# Altium footprint library Misc.PCBLIB: 128 footprints (part 3 of 8)
Each footprint in its own frame and in the unit in brackets; x right, y up, seen from the top. Pads: shape width x height; smd on the part's side, far side on the other; paste and mask are expansions set on the pad; w line width, h text height; cw(c..) or ccw(c..) is an arc to the next point about the centre after c.
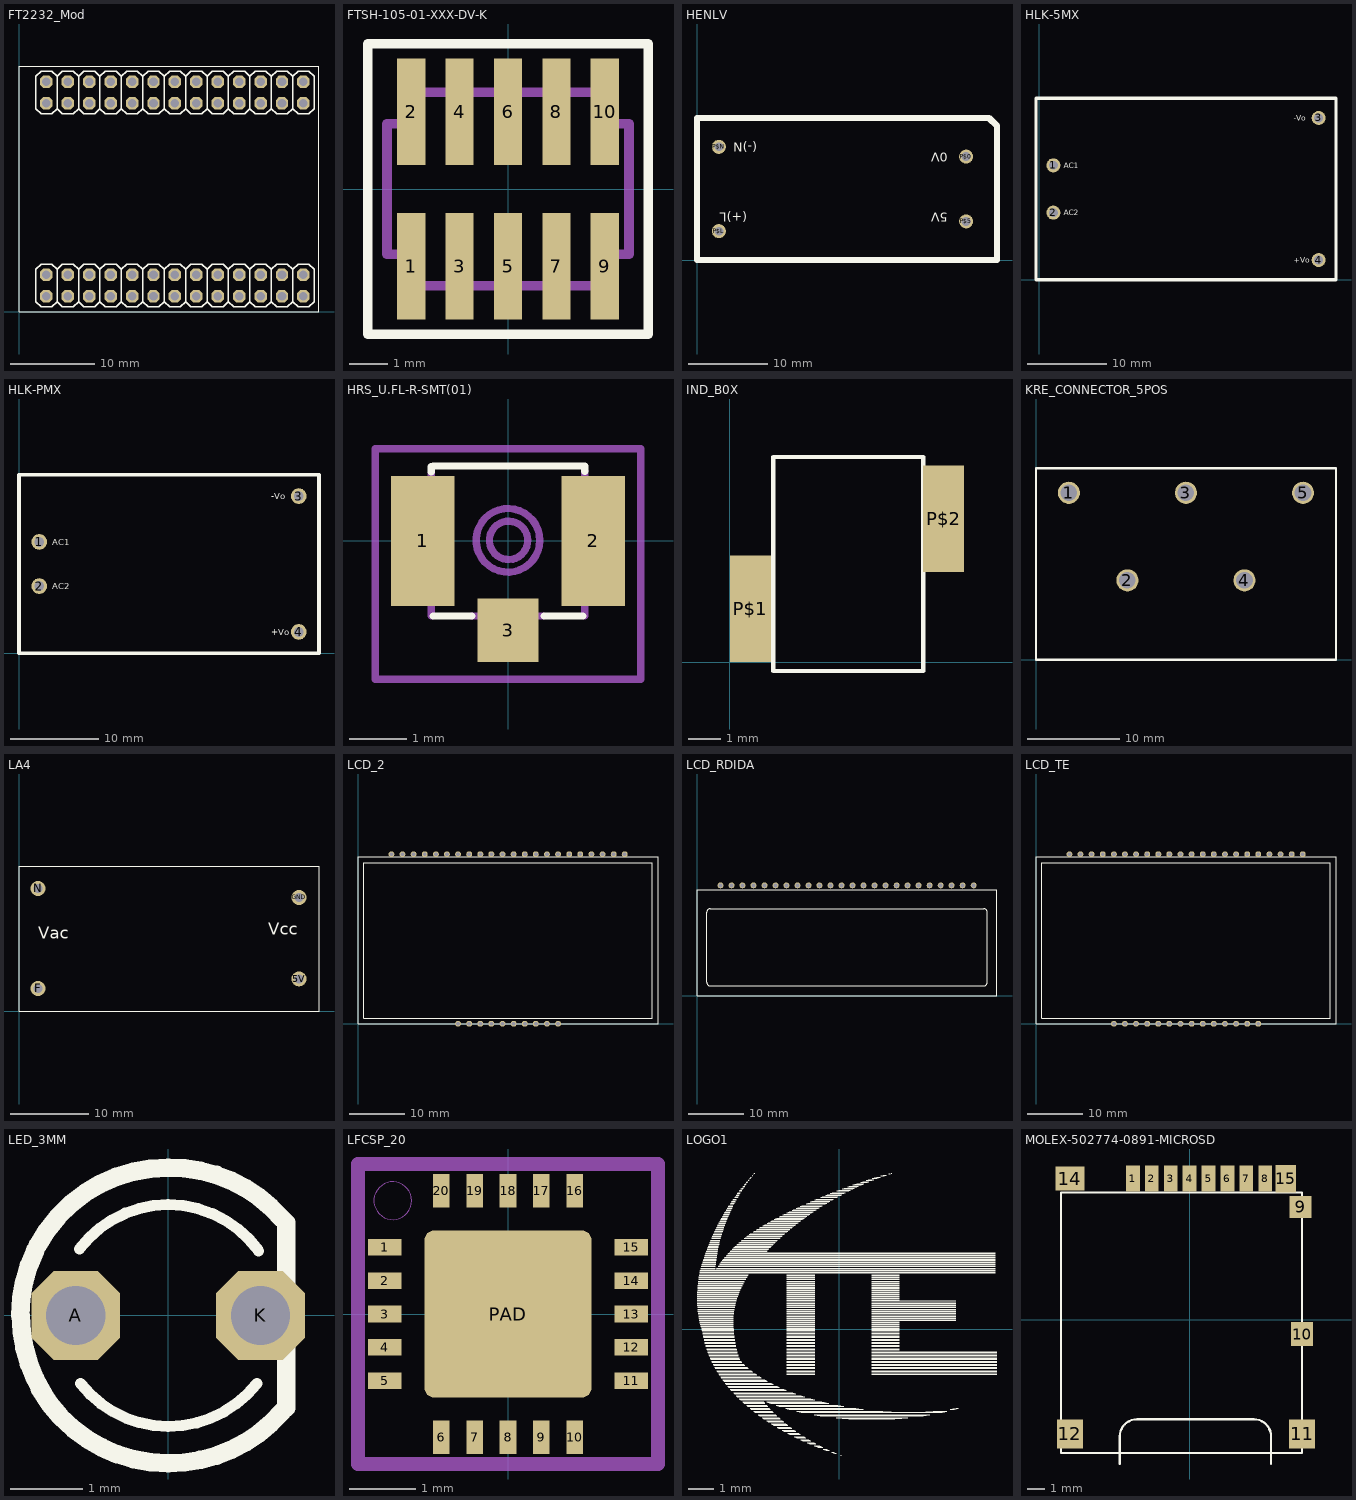
[diagram p2: the footprints below, top view; thin cyan lines are the x and y axes]

## FT2232_Mod [mil]
pads (52):
  oct 58.09x58.09 hole 40: CN2-1(127.95,73.23) CN2-2(127.95,173.23) CN2-3(227.95,73.23) CN2-4(227.95,173.23) CN2-5(327.95,73.23) CN2-6(327.95,173.23) CN2-7(427.95,73.23) CN2-8(427.95,173.23) CN2-9(527.95,73.23) CN2-10(527.95,173.23) CN2-11(627.95,73.23) CN2-12(627.95,173.23) CN2-13(727.95,73.23) CN2-14(727.95,173.23) CN2-15(827.95,73.23) CN2-16(827.95,173.23) CN2-17(927.95,73.23) CN2-18(927.95,173.23) CN2-19(1027.95,73.23) CN2-20(1027.95,173.23) CN2-21(1127.95,73.23) CN2-22(1127.95,173.23) CN2-23(1227.95,73.23) CN2-24(1227.95,173.23) CN2-25(1327.95,73.23) CN2-26(1327.95,173.23) CN3-1(127.95,974.41) CN3-2(127.95,1074.41) CN3-3(227.95,974.41) CN3-4(227.95,1074.41) CN3-5(327.95,974.41) CN3-6(327.95,1074.41) CN3-7(427.95,974.41) CN3-8(427.95,1074.41) CN3-9(527.95,974.41) CN3-10(527.95,1074.41) CN3-11(627.95,974.41) CN3-12(627.95,1074.41) CN3-13(727.95,974.41) CN3-14(727.95,1074.41) CN3-15(827.95,974.41) CN3-16(827.95,1074.41) CN3-17(927.95,974.41) CN3-18(927.95,1074.41) CN3-19(1027.95,974.41) CN3-20(1027.95,1074.41) CN3-21(1127.95,974.41) CN3-22(1127.95,1074.41) CN3-23(1227.95,974.41) CN3-24(1227.95,1074.41) CN3-25(1327.95,974.41) CN3-26(1327.95,1074.41)
Top Overlay:
  drawing of 188 lines, arcs and shapes, not listed
Mechanical 2:
  drawing of 52 lines, arcs and shapes, not listed
3D body "User Library-FT4232H-USB to UART.STEP": height 550.39, standoff 3.65, extent -22.05,0.01 1404.73,1147.64

## FTSH-105-01-XXX-DV-K [mil]
pads (10):
  rect 29x110 smd mask+2: 1(-100,-80) 2(-100,80) 3(-50,-80) 4(-50,80) 5(0,-80) 6(0,80) 7(50,-80) 8(50,80) 9(100,-80) 10(100,80)
Top Overlay:
  lines w10: -145,-150 -145,150 145,150 145,-150 -145,-150
Mechanical 1:
  lines w10: -125,-67.5 -125,67.5 -100,67.5 -100,100 100,100 100,67.5 125,67.5 125,-67.5 100,-67.5 100,-100 -100,-100 -100,-67.5 -125,-67.5
  text "J1" at -17.14,-17.5 h25

## HENLV [mil]
pads (4):
  round 70 hole 44: P$0(1343,516) P$5(1343,193) P$L(109,144) P$N(109,565)
Top Overlay:
  lines w32: 0,0 1497,0 1497,670 1457,709 0,709 0,0
  text "(+)L" at 250,250 h77.5
  text "(-)N" at 300,600 h77.5
  text "0V" at 1250,550 h77.5
  text "5V" at 1250,250 h77.5

## HLK-5MX [mil] "5W power supply"
pads (4):
  round 70 hole 44: 1(70.87,570.87) 2(70.87,334.65) 3(1393.7,807.09) 4(1393.7,98.43)
Top Overlay:
  lines w15.75: -15.75,0 -15.75,905.51 1480.32,905.51 1480.32,0 -15.75,0
  text "+Vo" at 1270.67,84.65 h27.56
  text "-Vo" at 1270.67,793.31 h27.56
  text "AC1" at 122.05,557.09 h27.56
  text "AC2" at 122.05,320.87 h27.56
3D body "User Library-HLK-5M05.step": height 708.67, standoff -196.85, extent -15.74,0.01 1480.33,905.52

## HLK-PMX [mil] "3W power supply"
pads (4):
  round 70 hole 44: 1(90.55,496.06) 2(90.55,299.21) 3(1248.03,700.79) 4(1248.03,94.49)
Top Overlay:
  lines w15.75: 0,0 0,795.28 1338.58,795.28 1338.58,0 0,0
  text "+Vo" at 1125,80.71 h27.56
  text "-Vo" at 1125,687.01 h27.56
  text "AC1" at 148.62,481.3 h27.56
  text "AC2" at 148.62,285.43 h27.56
3D body "HLK-PMX v2.step": height 590.94, standoff -98.43, extent 0.01,0 1338.59,795.28

## HRS_U.FL-R-SMT(01) [mm]
pads (3):
  rect 1.1x2.25 smd: 1(-1.475,0) 2(1.475,0)
  rect 1.05x1.1 smd: 3(0,-1.55)
Top Overlay:
  lines w0.127: -1.33,1.2 -1.33,1.29 ; -1.3,-1.3 -0.63,-1.3 ; -1.3,1.3 1.3,1.3 ; 0.63,-1.3 1.3,-1.3 ; 1.33,1.21 1.33,1.3
Mechanical 4:
  circle w0.127: c0.01,0.01 r0.332
  circle w0.127: c0,0.01 r0.552
  lines w0.127: -1.57,-0.89 -1.33,-0.89 -1.33,-0.9 ; -1.57,0.87 -1.33,0.87 -1.33,0.88 ; -1.56,-0.9 -1.56,0.88 ; -1.33,1.17 -1.33,-1.3 -1.31,-1.3 ; -0.63,-1.3 0.61,-1.3 ; 1.33,-1.3 1.33,1.21 ; 1.34,-0.91 1.34,-0.9 1.57,-0.9 1.57,0.88 1.38,0.88 ; -2.3,-2.4 -2.3,1.6 2.3,1.6 2.3,-2.4 -2.3,-2.4
3D body "SW3dPS-UFL-R-SMD.STEP": height 1.25, standoff 0, extent -1.7,-1.55 1.7,1.55

## IND_B0X [mil]
pads (2):
  rect 50x130 smd: P$1(25,65) P$2(261,175)
Top Overlay:
  lines w5: 53,-10.63 53,250 236,250 236,-10.63 53,-10.63

## KRE_CONNECTOR_5POS [mm] "KRE Connector 5pos 1kV"
pads (5):
  round 2.4 hole 1.8: 1(3.57,18.1) 2(9.92,8.6) 3(16.27,18.1) 4(22.62,8.6) 5(28.97,18.1)
Top Overlay:
  lines w0.254: 0,0 0,20.75 32.55,20.75 32.55,0 0,0

## LA4 [mil]
pads (4):
  round 76 hole 44: 5V(1400,163) F(95,115) GND(1400,570) N(95,615)
Top Overlay:
  lines w5: 0,0 0,725 1500,725 1500,0 0,0
  text "Vcc" at 1245,365 h102.3
  text "Vac" at 95,345 h102.3

## LCD_2 [mil]
pads (32):
  round 42 hole 28: 1(1890,1201) 2(1812,1201) 3(1733,1201) 4(1654,1201) 5(1575,1201) 6(1497,1201) 7(1418,1201) 8(1339,1201) 9(1260,1201) 10(1182,1201) 11(1103,1201) 12(1024,1201) 13(945,1201) 14(867,1201) 15(788,1201) 16(709,1201) 17(630,1201) 18(552,1201) 19(473,1201) 20(394,1201) 21(315,1201) 22(237,1201) 23(1418,0) 24(1339,0) 25(1260,0) 26(1182,0) 27(1103,0) 28(1024,0) 29(945,0) 30(867,0) 31(788,0) 32(709,0)
Top Overlay:
  lines w5: 0,0 2126,0 2126,1182 0,1182 0,0 ; 40,40 2087,40 2087,1142 40,1142 40,40

## LCD_RDIDA [mil]
pads (24):
  round 42 hole 28: P$1(168,788) P$2(247,788) P$3(325,788) P$4(404,788) P$5(483,788) P$6(562,788) P$7(640,788) P$8(719,788) P$9(798,788) P$10(876,788) P$11(955,788) P$12(1034,788) P$13(1113,788) P$14(1191,788) P$15(1270,788) P$16(1349,788) P$17(1428,788) P$18(1506,788) P$19(1585,788) P$20(1664,788) P$21(1743,788) P$22(1821,788) P$23(1900,788) P$24(1979,788)
Top Overlay:
  lines w5: 0,0 0,758 2146,758 2146,0 0,0 ; 69,94 ccw(c94,94) 94,69 2052,69 ccw(c2052,94) 2077,94 2077,596 ccw(c2052,596) 2052,621 94,621 ccw(c94,596) 69,596 69,94

## LCD_TE [mil]
pads (36):
  round 42 hole 28: 1(237,1201) 2(315,1201) 3(394,1201) 4(473,1201) 5(552,1201) 6(630,1201) 7(709,1201) 8(788,1201) 9(867,1201) 10(945,1201) 11(1024,1201) 12(1103,1201) 13(1182,1201) 14(1260,1201) 15(1339,1201) 16(1418,1201) 17(1497,1201) 18(1575,1201) 19(1654,1201) 20(1733,1201) 21(1812,1201) 22(1890,1201) 23(552,0) 24(630,0) 25(709,0) 26(788,0) 27(867,0) 28(945,0) 29(1024,0) 30(1103,0) 31(1182,0) 32(1260,0) 33(1339,0) 34(1418,0) 35(1497,0) 36(1575,0)
Top Overlay:
  lines w5: 0,0 2126,0 2126,1182 0,1182 0,0 ; 40,40 2087,40 2087,1142 40,1142 40,40
3D body: height 551.18, standoff 468.5, extent 0,0 2126,1182

## LED_3MM [mil]
pads (2):
  oct 48x48 hole 32: A(-50,0) K(50,0)
Top Overlay:
  lines w6: -48,36 cw(c0,0) 0,60 cw(c0.21,-0.11) 49,35 ; -47.36,-36.83 ccw(c0,0) 0,-60 ccw(c0.32,0.65) 48,-36.83
  lines w10: -80.01,0.22 cw(c-0.01,0.23) -71.85,35.43 ; -79.72,0 ccw(c0.28,0) -67.85,-41.93 ; -70.59,38 cw(c-0.29,0.18) 0,80 cw(c1.11,-0.19) 62,52 ; -69.46,-39.69 ccw(c0,0) 0,-80 ccw(c0.47,1) 62,-51.68 ; 63.99,-49.84 63.99,50.16
3D body "User Library-led 3mm black.STEP": height 265.87, standoff -28.43, extent -65.51,-65.07 61,64.74

## LFCSP_20 [mm]
pads (21):
  rect 0.5x0.25 smd: 1(-1.85,1) 2(-1.85,0.5) 3(-1.85,0) 4(-1.85,-0.5) 5(-1.85,-1) 11(1.85,-1) 12(1.85,-0.5) 13(1.85,0) 14(1.85,0.5) 15(1.85,1)
  rect 0.25x0.5 smd: 6(-1,-1.85) 7(-0.5,-1.85) 8(0,-1.85) 9(0.5,-1.85) 10(1,-1.85) 16(1,1.85) 17(0.5,1.85) 18(0,1.85) 19(-0.5,1.85) 20(-1,1.85)
  rrect10% 2.5x2.5 smd paste-2: PAD(0,0)
Top Paste:
  region: 0.027,0.507 0.053,0.505 0.079,0.502 0.106,0.497 0.131,0.491 0.157,0.483 0.182,0.474 0.207,0.464 0.231,0.453 0.254,0.44 0.277,0.426 0.299,0.411 0.32,0.395 0.34,0.378 0.359,0.359 0.378,0.34 0.395,0.32 0.411,0.299 0.426,0.277 0.44,0.254 0.453,0.231 0.464,0.207 0.474,0.182 0.483,0.157 0.491,0.131 0.497,0.106 0.502,0.079 0.505,0.053 0.507,0.027 0.508,0 0.507,-0.027 0.505,-0.053 0.502,-0.079 0.497,-0.106 0.491,-0.131 0.483,-0.157 0.474,-0.182 0.464,-0.207 0.453,-0.231 0.44,-0.254 0.426,-0.277 0.411,-0.299 0.395,-0.32 0.378,-0.34 0.359,-0.359 0.34,-0.378 0.32,-0.395 0.299,-0.411 0.277,-0.426 0.254,-0.44 0.231,-0.453 0.207,-0.464 0.182,-0.474 0.157,-0.483 0.131,-0.491 0.106,-0.497 0.079,-0.502 0.053,-0.505 0.027,-0.507 0,-0.508 -0.027,-0.507 -0.053,-0.505 -0.079,-0.502 -0.106,-0.497 -0.131,-0.491 -0.157,-0.483 -0.182,-0.474 -0.207,-0.464 -0.231,-0.453 -0.254,-0.44 -0.277,-0.426 -0.299,-0.411 -0.32,-0.395 -0.34,-0.378 -0.359,-0.359 -0.378,-0.34 -0.395,-0.32 -0.411,-0.299 -0.426,-0.277 -0.44,-0.254 -0.453,-0.231 -0.464,-0.207 -0.474,-0.182 -0.483,-0.157 -0.491,-0.131 -0.497,-0.106 -0.502,-0.079 -0.505,-0.053 -0.507,-0.027 -0.508,0 -0.507,0.027 -0.505,0.053 -0.502,0.079 -0.497,0.106 -0.491,0.131 -0.483,0.157 -0.474,0.182 -0.464,0.207 -0.453,0.231 -0.44,0.254 -0.426,0.277 -0.411,0.299 -0.395,0.32 -0.378,0.34 -0.359,0.359 -0.34,0.378 -0.32,0.395 -0.299,0.411 -0.277,0.426 -0.254,0.44 -0.231,0.453 -0.207,0.464 -0.182,0.474 -0.157,0.483 -0.131,0.491 -0.106,0.497 -0.079,0.502 -0.053,0.505 -0.027,0.507 0,0.508
Mechanical 13:
  circle w0: c-1.729,1.7 r0.283
  lines w0.203: -2.25,-2.25 2.25,-2.25 2.25,2.25 -2.25,2.25 -2.25,-2.25
3D body "step_temp.STEP": height 0.8, standoff 0, extent -2,-2 2,2

## LOGO1 [mil]
Top Overlay:
  drawing of 2414 lines, arcs and shapes, not listed

## MOLEX-502774-0891-MICROSD [mil]
pads (14):
  rect 31.5x59.06 smd: 1(-129.92,322.83) 2(-86.61,322.83) 3(-43.31,322.83) 4(0,322.83) 5(43.31,322.83) 6(86.61,322.83) 7(129.92,322.83) 8(173.23,322.83)
  rect 50.79x51.18 smd: 9(254.13,257.87)
  rect 50.79x55.12 smd: 10(257.48,-33.46)
  rect 59.06x66.93 smd: 11(257.48,-261.81) 12(-274.02,-261.81)
  rect 66.93x55.12 smd: 14(-274.02,322.83)
  rect 47.24x62.99 smd: 15(220.47,322.83)
Top Overlay:
  lines w5: -159.84,-330.71 -159.84,-267.72 cw(c-120.47,-267.72) -120.47,-228.35 147.24,-228.35 cw(c147.24,-267.72) 186.61,-267.72 186.61,-330.71 ; -294.88,-305.71 257.48,-305.71 257.48,291.34 -294.88,291.34 -294.88,-305.71
3D body "5027740891.stp": height 70.08, standoff -0.79, extent -299.02,-290.75 263.97,339.17